# Altium footprint library misc.PcbLib: 40 footprints (part 2 of 3)
Each footprint in its own frame and in the unit in brackets; x right, y up, seen from the top. Pads: shape width x height; smd on the part's side, far side on the other; paste and mask are expansions set on the pad; w line width, h text height; cw(c..) or ccw(c..) is an arc to the next point about the centre after c.
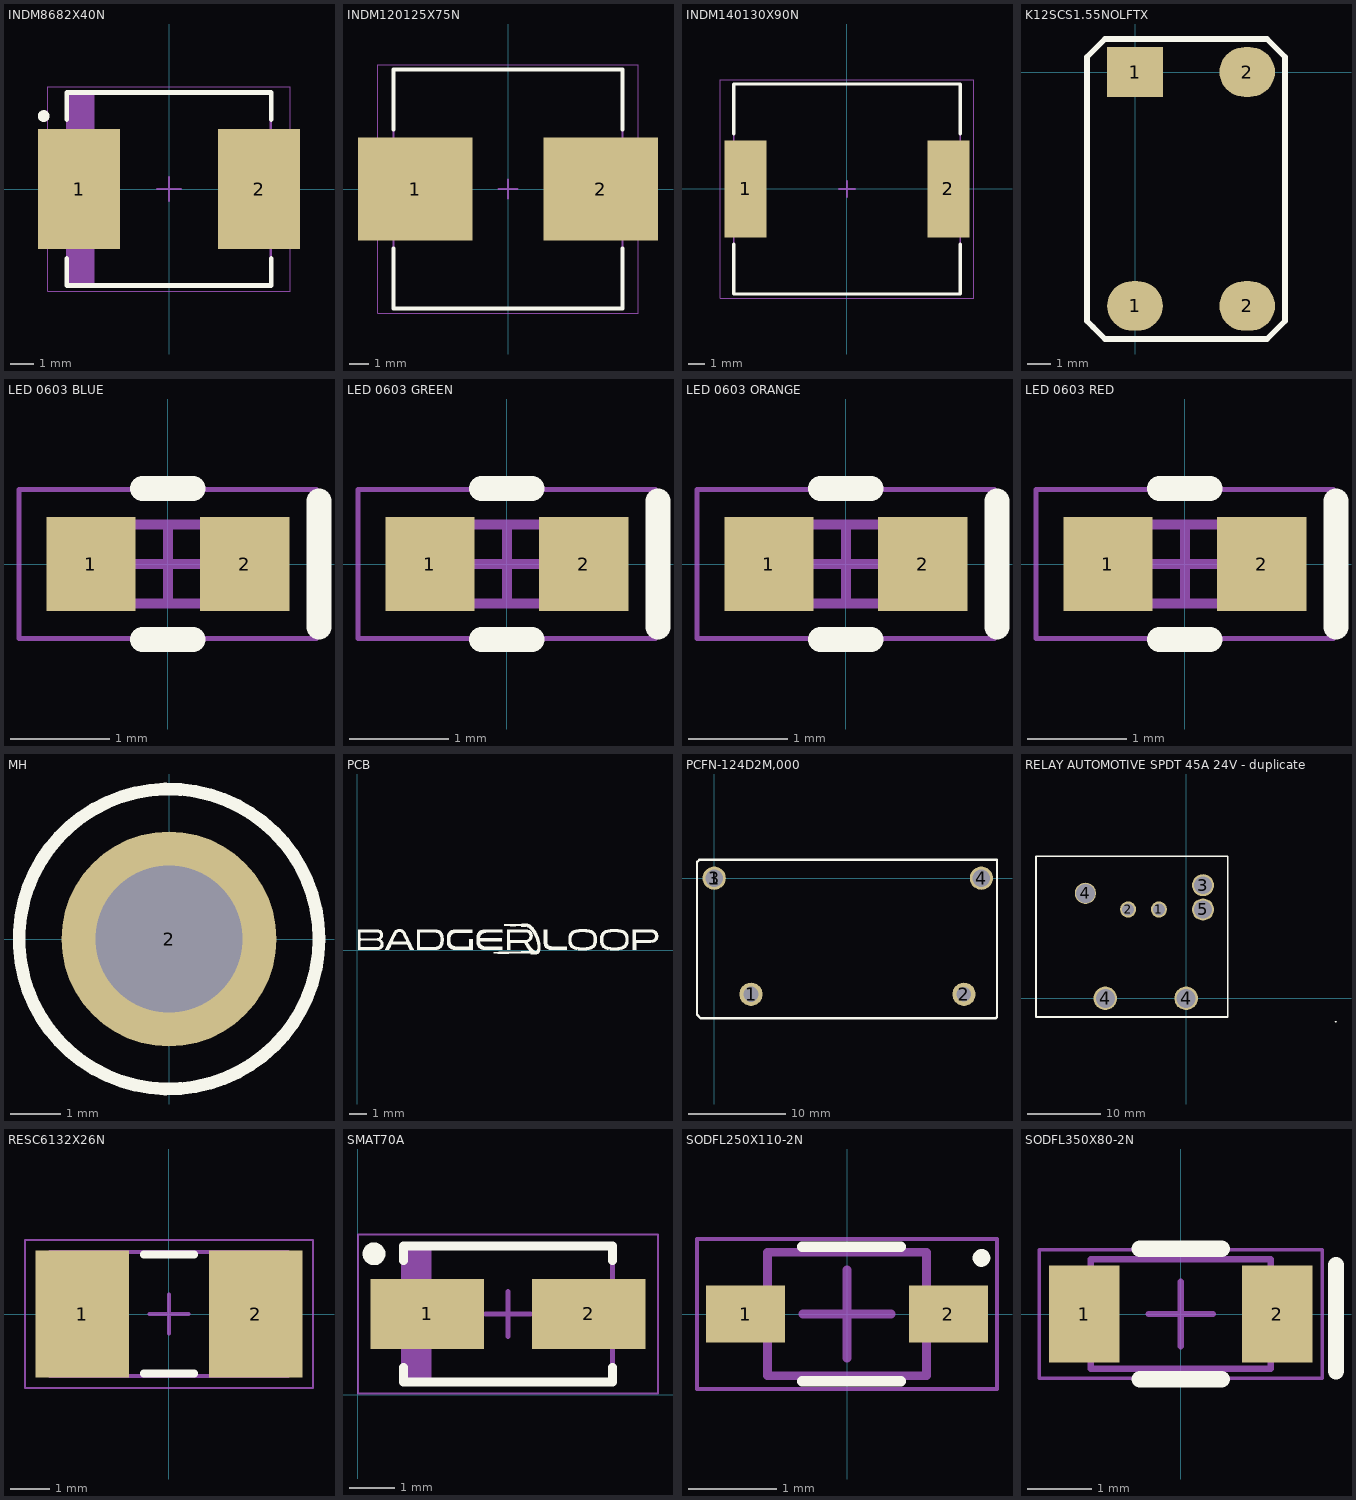
[diagram p1: the footprints below, top view; thin cyan lines are the x and y axes]

## INDM8682X40N [mm] "Molded Inductor, 2-Leads, Body 8.64x8.18mm, IPC Medium Density"
height 4
pads (2):
  rect 3.5x5.1 smd: 1(-3.825,0) 2(3.825,0)
Top Overlay:
  circle w0.25: c-5.325,3.1 r0.125
  lines w0.2: -4.35,-2.95 -4.35,-4.1 4.35,-4.1 4.35,-2.95 ; -4.35,2.95 -4.35,4.1 4.35,4.1 4.35,2.95
Mechanical 13:
  rectangle: -4.32,-4.09 -3.158,4.09
  lines w0.1: -4.32,-4.09 4.32,-4.09 4.32,4.09 -4.32,4.09 -4.32,-4.09
Mechanical 15:
  lines w0.05: -5.15,-4.35 5.15,-4.35 5.15,4.35 -5.15,4.35 -5.15,-4.35
  lines w0.1: -0.5,0 0.5,0 ; 0,-0.5 0,0.5
3D body "INDM8682X40N.step": height 4, standoff 0, extent -4.54,-4.09 4.54,4.09

## INDM120125X75N [mm] "Molded Inductor, 2-Leads, Body 12.00x12.50mm, IPC Medium Density"
height 7.5
pads (2):
  rect 6x5.4 smd: 1(-4.85,0) 2(4.85,0)
Top Overlay:
  lines w0.2: -6,-3.1 -6,-6.25 6,-6.25 6,-3.1 ; -6,3.1 -6,6.25 6,6.25 6,3.1
Mechanical 13:
  lines w0.1: -6,-6.25 6,-6.25 6,6.25 -6,6.25 -6,-6.25
Mechanical 15:
  lines w0.05: -6.825,-6.5 6.825,-6.5 6.825,6.5 -6.825,6.5 -6.825,-6.5
  lines w0.1: -0.5,0 0.5,0 ; 0,-0.5 0,0.5
3D body "INDM120125X75N.step": height 7.5, standoff 0, extent -6.22,-6.25 6.22,6.25

## INDM140130X90N [mm] "Molded Inductor, 2-Leads, Body 14.00x13.00mm, IPC Medium Density"
height 9
pads (2):
  rect 2.6x6 smd: 1(-6.275,0) 2(6.275,0)
Top Overlay:
  lines w0.2: -7,-3.4 -7,-6.5 7,-6.5 7,-3.4 ; -7,3.4 -7,6.5 7,6.5 7,3.4
Mechanical 13:
  lines w0.1: -7,-6.5 -7,6.5 7,6.5 7,-6.5 -7,-6.5
Mechanical 15:
  lines w0.05: -7.825,-6.75 -7.825,6.75 7.825,6.75 7.825,-6.75 -7.825,-6.75
  lines w0.1: -0.5,0 0.5,0 ; 0,-0.5 0,0.5
3D body "INDM140130X90N.step": height 9, standoff 0, extent -7.22,-6.5 7.22,6.5

## K12SCS1.55NOLFTX [mm]
pads (4):
  oval 2.35x2.1 smd: 1(0,-9.9) 2(4.75,-9.9) 2(4.75,0)
  rect 2.35x2.1 smd: 1(0,0)
Top Overlay:
  lines w0.254: -2.032,-10.541 -2.032,0.635 -1.27,1.397 5.588,1.397 6.35,0.635 6.35,-10.541 5.588,-11.303 -1.27,-11.303 -1.778,-10.795 -2.032,-10.541
3D body "K12SCS1.55NOLFTX.stp": height 9.08, standoff 0, extent -3.114,-10.753 7.686,0.847

## LED 0603 BLUE [mm] "Chip Diode, 2-Leads, Body 1.60x0.80mm"
height 0.75
pads (2):
  rect 0.9x0.95 smd: 1(-0.775,0) 2(0.775,0)
Top Overlay:
  lines w0.254: -0.254,-0.762 0.254,-0.762 ; -0.254,0.762 0.254,0.762 ; 1.524,-0.635 1.524,0.635
Mechanical 13:
  lines w0.1: -0.8,-0.4 -0.8,0.4 0.8,0.4 0.8,-0.4 -0.8,-0.4
Mechanical 15:
  lines w0.05: -1.5,-0.75 -1.5,0.75 1.5,0.75 1.5,-0.75 -1.5,-0.75
  lines w0.1: -0.4,0 0.4,0 ; 0,-0.4 0,0.4
3D body: height 0.8, standoff 0, extent -0.4,-0.4 0.4,0.4
3D body: height 0.8, standoff 0, extent -0.8,-0.4 -0.4,0.4
3D body: height 0.8, standoff 0, extent 0.4,-0.4 0.8,0.4

## LED 0603 GREEN [mm] "Chip Diode, 2-Leads, Body 1.60x0.80mm, IPC Medium Density"
height 0.8
pads (2):
  rect 0.9x0.95 smd: 1(-0.775,0) 2(0.775,0)
Top Overlay:
  lines w0.254: -0.254,-0.762 0.254,-0.762 ; -0.254,0.762 0.254,0.762 ; 1.524,-0.635 1.524,0.635
Mechanical 13:
  lines w0.1: -0.8,-0.4 0.8,-0.4 0.8,0.4 -0.8,0.4 -0.8,-0.4
Mechanical 15:
  lines w0.05: -1.5,-0.75 1.5,-0.75 1.5,0.75 -1.5,0.75 -1.5,-0.75
  lines w0.1: -0.4,0 0.4,0 ; 0,-0.4 0,0.4
3D body: height 0.8, standoff 0, extent 0.4,-0.4 0.8,0.4
3D body: height 0.8, standoff 0, extent -0.8,-0.4 -0.4,0.4
3D body: height 0.8, standoff 0, extent -0.4,-0.4 0.4,0.4

## LED 0603 ORANGE [mm] "Chip Diode, 2-Leads, Body 1.60x0.80mm"
height 0.75
pads (2):
  rect 0.9x0.95 smd: 1(-0.775,0) 2(0.775,0)
Top Overlay:
  lines w0.254: -0.254,-0.762 0.254,-0.762 ; -0.254,0.762 0.254,0.762 ; 1.524,-0.635 1.524,0.635
Mechanical 13:
  lines w0.1: -0.8,-0.4 -0.8,0.4 0.8,0.4 0.8,-0.4 -0.8,-0.4
Mechanical 15:
  lines w0.05: -1.5,-0.75 -1.5,0.75 1.5,0.75 1.5,-0.75 -1.5,-0.75
  lines w0.1: -0.4,0 0.4,0 ; 0,-0.4 0,0.4
3D body: height 0.8, standoff 0, extent -0.4,-0.4 0.4,0.4
3D body: height 0.8, standoff 0, extent -0.8,-0.4 -0.4,0.4
3D body: height 0.8, standoff 0, extent 0.4,-0.4 0.8,0.4

## LED 0603 RED [mm] "Chip Diode, 2-Leads, Body 1.60x0.80mm, IPC Medium Density"
height 0.8
pads (2):
  rect 0.9x0.95 smd: 1(-0.775,0) 2(0.775,0)
Top Overlay:
  lines w0.254: -0.254,-0.762 0.254,-0.762 ; -0.254,0.762 0.254,0.762 ; 1.524,-0.635 1.524,0.635
Mechanical 13:
  lines w0.1: -0.8,-0.4 -0.8,0.4 0.8,0.4 0.8,-0.4 -0.8,-0.4
Mechanical 15:
  lines w0.05: -1.5,-0.75 -1.5,0.75 1.5,0.75 1.5,-0.75 -1.5,-0.75
  lines w0.1: -0.4,0 0.4,0 ; 0,-0.4 0,0.4
3D body: height 0.8, standoff 0, extent -0.4,-0.4 0.4,0.4
3D body: height 0.8, standoff 0, extent -0.8,-0.4 -0.4,0.4
3D body: height 0.8, standoff 0, extent 0.4,-0.4 0.8,0.4

## MH [mm] "#10 Mount Hole"
pads (1):
  round 4.3 hole 2.946 unplated: 2(0,0)
Top Overlay:
  circle w0.254: c0,0 r3
3D body "4_40_Screw.stp": height 2.84, standoff -6.35, extent -2.324,-2.578 2.324,2.07

## PCB [mm]
Top Overlay:
  drawing of 10 lines, arcs and shapes, not listed
  text ".Pcb_File_Name_No_Path" at 0.05,-2.794 h1.52
  text ".Revision" at 10.16,-2.794 h1.52
  text ".Designer" at 10.16,-5.063 h1.52
  text ".Engineer" at 0.05,-5.08 h1.52

## PCFN-124D2M,000 [mm]
pads (5):
  round 2.4 hole 1.8: 1(0,0) 3(0,0) 4(27.6,0)
  round 2.4 hole 1.6: 1(3.8,-12)
  round 2.4 hole 1.5: 2(25.8,-12)
Top Overlay:
  lines w0.254: -1.778,-14.097 -1.778,1.651 -1.524,1.905 28.956,1.905 29.21,1.905 29.21,-14.351 29.083,-14.478 -1.397,-14.478 -1.778,-14.097
3D body "c-1461193-9-c-3d.stp": height 29, standoff -2.5, extent -1.484,-14.223 28.916,1.777

## RELAY AUTOMOTIVE SPDT 45A 24V - duplicate [mm]
pads (7):
  round 2.2 hole 1.6: 1(-3.7,12.1) 2(-7.9,12.1)
  round 3 hole 2.4: 3(2.3,15.4) 5(2.3,12.1)
  round 2.896 hole 2.591: 4(-13.7,14.3)
  round 3.2 hole 2.591: 4(-11,0) 4(0,0)
Top Overlay:
  lines w0.254: 5.588,-2.54 -20.432,-2.54 -20.432,19.335 5.668,19.335 5.668,-2.54 ; 20.4,-3.175 20.32,-3.175 ; 20.32,-3.175 20.32,-3.175
3D body "1-1393277-8.stp": height 24.2, standoff 0, extent -20.385,-2.168 5.715,18.932

## RESC6132X26N [mm] "Chip Resistor, 2-Leads, Body 6.10x3.18mm, IPC Medium Density"
height 2.57
pads (2):
  rect 2.4x3.25 smd: 1(-2.225,0) 2(2.225,0)
Top Overlay:
  lines w0.2: -0.65,-1.525 0.65,-1.525 ; -0.65,1.525 0.65,1.525
Mechanical 13:
  lines w0.1: -3.05,-1.59 3.05,-1.59 3.05,1.59 -3.05,1.59 -3.05,-1.59
Mechanical 15:
  lines w0.05: -3.7,-1.9 3.7,-1.9 3.7,1.9 -3.7,1.9 -3.7,-1.9
  lines w0.1: -0.5,0 0.5,0 ; 0,-0.5 0,0.5
3D body: height 2.57, standoff 0, extent 1.05,-1.59 3.05,1.59
3D body: height 2.57, standoff 0, extent -3.05,-1.59 -1.05,1.59
3D body: height 2.57, standoff 0, extent -1.05,-1.59 1.05,1.59

## SMAT70A [mm]
pads (2):
  rect 2.5x1.55 smd: 1(1.524,1.778) 2(5.08,1.778)
Top Overlay:
  circle w0.25: c0.352,3.103 r0.125
  lines w0.2: 1.002,0.603 1.002,0.278 5.602,0.278 5.602,0.603 ; 1.002,2.953 1.002,3.278 5.602,3.278 5.602,2.953
Mechanical 13:
  rectangle: 1.002,0.318 1.621,3.238
  lines w0.1: 1.002,0.318 5.602,0.318 5.602,3.238 1.002,3.238 1.002,0.318
Mechanical 15:
  lines w0.05: 0,0.028 6.604,0.028 6.604,3.528 0,3.528 0,0.028
  lines w0.1: 2.802,1.778 3.802,1.778 ; 3.302,1.278 3.302,2.278
3D body "DIOM4326X23N.step": height 2.3, standoff 0, extent 0.782,0.318 5.822,3.238

## SODFL250X110-2N [mm] "SODFL, 2-Leads, Body 1.30x2.50mm, IPC Medium Density"
height 1.1
pads (2):
  rect 0.9x0.65 smd: 1(-1.15,0) 2(1.15,0)
Top Overlay:
  circle w0.1: c1.524,0.635 r0.05
  lines w0.12: -0.508,-0.762 0.61,-0.762 ; -0.508,0.762 0.61,0.762
Mechanical 13:
  lines w0.1: -0.9,-0.7 -0.9,0.7 0.9,0.7 0.9,-0.7 -0.9,-0.7
Mechanical 15:
  lines w0.05: -1.7,-0.85 -1.7,0.85 1.7,0.85 1.7,-0.85 -1.7,-0.85
  lines w0.1: -0.5,0 0.5,0 ; 0,-0.5 0,0.5
3D body "SODFL250X110-2N.step": height 1.1, standoff 0, extent -1.25,-0.7 1.25,0.7

## SODFL350X80-2N [mm] "SODFL, 2-Leads, Body 1.60x3.50mm, IPC Medium Density"
height 0.8
pads (2):
  rect 1.1x1.5 smd: 1(-1.5,0) 2(1.5,0)
Top Overlay:
  lines w0.254: -0.635,-1.016 0.635,-1.016 ; -0.635,1.016 0.635,1.016 ; 2.413,-0.889 2.413,0.762
Mechanical 13:
  lines w0.1: -1.4,-0.85 1.4,-0.85 1.4,0.85 -1.4,0.85 -1.4,-0.85
Mechanical 15:
  lines w0.05: -2.2,-1 2.2,-1 2.2,1 -2.2,1 -2.2,-1
  lines w0.1: -0.5,0 0.5,0 ; 0,-0.5 0,0.5
3D body: height 0.8, standoff 0, extent -1.4,-0.85 1.4,0.85